# Altium integrated library Integrated_Library1.IntLib: 305 symbols (part 1 of 2)
Pins are listed as number, name and electrical type; pins without a type are passive.

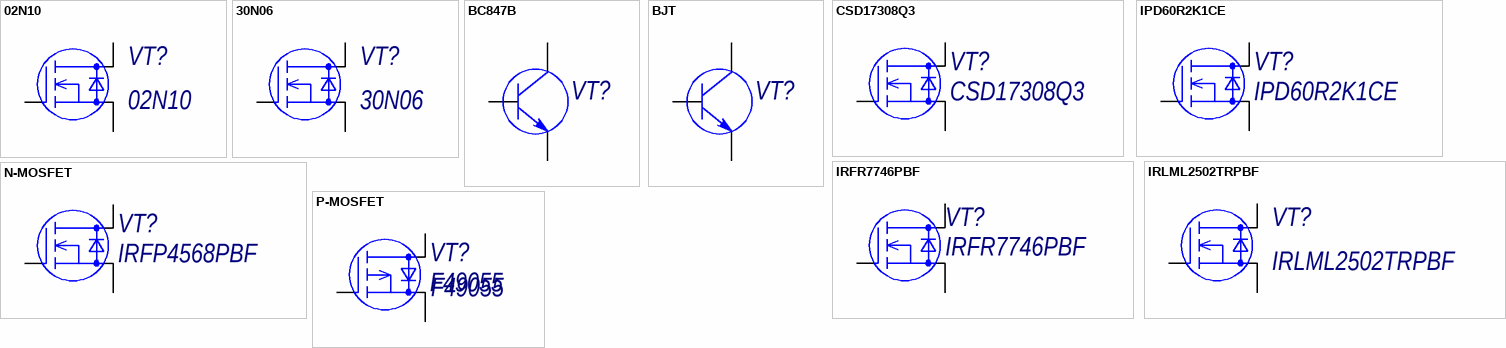
[diagram p0: symbols 02N10 to P-MOSFET]

## 02N10
designator VT?
N-MOSFET 100В 2А; Manufacturer: Hottech Co. Ltd; Name: 02N10
footprint SOT23-3 (SOT23, 3-Leads, Body 2,90x2,30mm, Pitch 0,95mm, IPC Medium Density)
pins: 1 G, 2 S, 3 D

## 30N06
designator VT?
N-MOSFET 60В 30А; Manufacturer: UMW Youtai Semiconductor; Name: 30N06
footprint D-PAK (D-PAK, 3-Pads, Body 6,21x6,73mm (max), IPC High Density)
pins: 1 G, 2 S, 3 D

## BC847B
designator VT?  (value not drawn)
Биполярный NPN транзистор 45В 100мА; Manufacturer: NXP Semiconductor; Name: BC847B
footprint SOT23-3 (SOT23, 3-Leads, Body 2,90x2,30mm, Pitch 0,95mm, IPC Medium Density)
pins: 1, 2, 3

## BJT
designator VT?, comment -  (value not drawn)
Биполярный NPN транзистор; TU: -; Manufacturer: -; Name: -
footprint SOT23-3 (SOT23, 3-Leads, Body 2,90x2,30mm, Pitch 0,95mm, IPC Medium Density)
pins: 1, 2, 3

## CSD17308Q3
designator VT?
N-MOSFET 30В 47А; Manufacturer: Texas Instruments; Name: CSD17308Q3
pins: 1 G, 2 D, 3 S

## IPD60R2K1CE
designator VT?
N-MOSFET 600В 3,7А; Manufacturer: Infineon; Name: IPD60R2K1CE
footprint D-PAK (Footprint not found)
pins: 1 G, 2 D, 3 S

## IRFR7746PBF
designator VT?
N-MOSFET 75В, 56А; Manufacturer: Internationa Rectifier; Name: IRFR7746PBF
footprint D-PAK (D-PAK, 3-Pads, Body 6,21x6,73mm (max), IPC High Density)
pins: 1 G, 2 D, 3 S

## IRLML2502TRPBF
designator VT?
N-MOSFET 20В 4,5А; Manufacturer: International Rectifier; Name: IRLML2502TRPBF
footprint SOT23-3 (SOT23, 3-Leads, Body 2,90x2,30mm, Pitch 0,95mm, IPC Medium Density)
pins: 1 G, 2 S, 3 D

## N-MOSFET
designator VT?, comment IRFP4568PBF
N-MOSFET; Name: IRFP4568PBF; Link: *
footprint D-PAK (D-PAK, 3-Pads, Body 6,21x6,73mm (max), IPC High Density)
pins: 1 G, 2 D, 3 S

## P-MOSFET
designator VT?, comment F49055
P-MOSFET; Manufacturer: IRF; Link: *; Name: F49055
footprint D2PAK
pins: 1 G, 2 D, 3 S


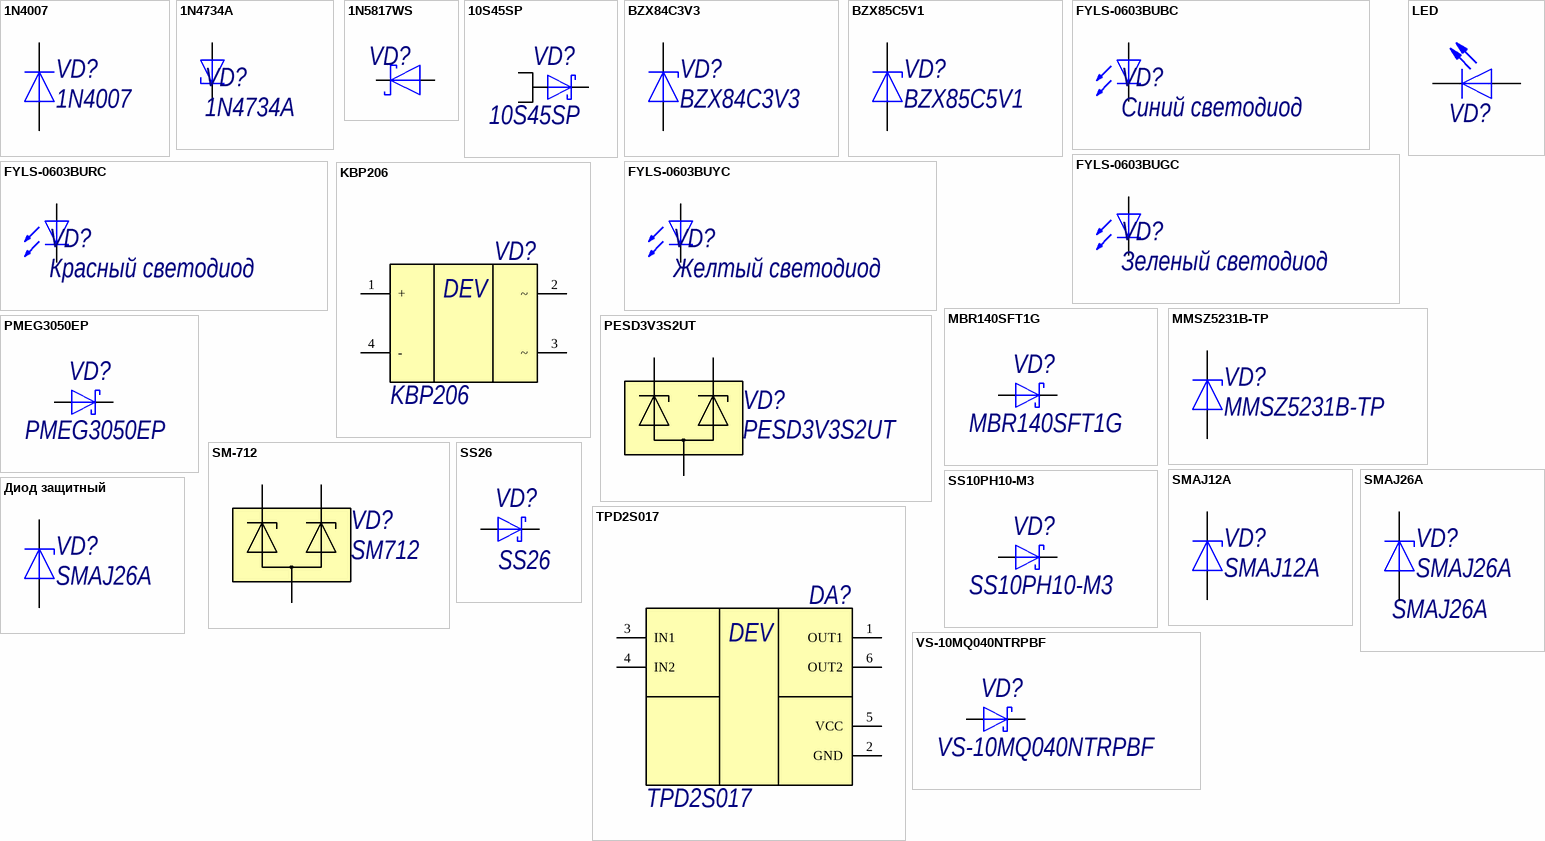
[diagram p1: symbols 1N4007 to Диод защитный]

## 1N4007
designator VD?
Диод выпрямиельный 1000В 1А; Name: 1N4007
pins: 1 A, 3 K

## 1N4734A
designator VD?
Стабилитрон 5.6В, 5%, 1Вт, 1N4734A; Voltage MAX: 5.88; Voltage MIN: 5.32; Name: 1N4734A; ComponentLink1Description: HelpURL; ComponentLink1URL: https://www.promelec.ru/fs/sources/54/98/aa/7a/f161d9308e45db5c55639eb6.pdf
footprint DO-41 (zener diode)
footprint DO-41 Vertical
pins: 1 A, 2 K

## 1N5817WS
designator VD?  (value not drawn)
Диод Шоттки 1N5817WS 20V 1А 0.45V; Производитель: Hottech Co. Ltd; current: 1A; voltage: 20В; drop voltage: 0,45В; Name: 1N5817WS
footprint SOD323
pins: 1 K, 2 A

## 10S45SP
designator VD?
Диод Шоттки 45В 10А; Manufacturer: YFW; Name: 10S45SP
footprint TO-277A (SMPC (TO-277A))
pins: 1 A, 2 A, 3 K

## BZX84C3V3
designator VD?
Стабилитрон 3,3В; Name: BZX84C3V3
footprint SOT23-3 (SOT23, 3-Leads, Body 2,90x2,30mm, Pitch 0,95mm, IPC Medium Density)
pins: 1 A, 3 K

## BZX85C5V1
designator VD?
Стабилитрон 5,1В; Name: BZX85C5V1
pins: 1 A, 3 K

## FYLS-0603BUBC
designator VD?, comment Синий светодиод
Светодтод синий SMD Foryard Optoelectronics Co.; Name: Синий светодиод
footprint VD0603
footprint VD0603 - no point
pins: 1 A, 2 K

## FYLS-0603BUGC
designator VD?, comment Зеленый светодиод
Светодтод зеленый SMD Foryard Optoelectronics Co.; Name: Зеленый светодиод
footprint VD0603
footprint VD0603 - no point
pins: 1 A, 2 K

## FYLS-0603BURC
designator VD?, comment Красный светодиод
Светодтод красный SMD Foryard Optoelectronics Co.; Name: Красный светодиод
footprint VD0603
footprint VD0603 - no point
pins: 1 A, 2 K

## FYLS-0603BUYC
designator VD?, comment Желтый светодиод
Светодтод желтый SMD Foryard Optoelectronics Co.; Name: Желтый светодиод
footprint VD0603
footprint VD0603 - no point
pins: 1 A, 2 K

## KBP206
designator VD?
Диодный мост; Manufacturer: DC Components; Name: KBP206
footprint KBP (Вертикальный диодный мост)
pins: 1 +, 2 ~, 3 ~, 4 -
text: DEV

## LED
designator VD?
Светодиод
footprint LED_0603
pins: 1 K, 2 A

## MBR140SFT1G
designator VD?
Диод Шоттки 40В 1А; Name: MBR140SFT1G
footprint SOD123
pins: 1 K, 2 A

## MMSZ5231B-TP
designator VD?
Стабилитрон 5,1В; Name: MMSZ5231B-TP
footprint SOD123
pins: 1 K, 2 A

## PESD3V3S2UT
designator VD?
Сборка TVS-диодов; Name: PESD3V3S2UT
pins: 1, 2, 3

## PMEG3050EP
designator VD?
Диод Шоттки 30В 5А; Manufacturer: NXP; Name: PMEG3050EP
footprint SOD128
pins: 1 K, 2 A

## SM-712
designator VD?, comment SM712
Сборка TVS-диодов для RS485; Name: SM712
footprint SOT23-3 (SOT23, 3-Leads, Body 2,90x2,30mm, Pitch 0,95mm, IPC Medium Density)
pins: 1, 2, 3

## SMAJ12A
designator VD?
Диод защитный 12В; Name: SMAJ12A
pins: 1 K, 2 A

## SMAJ26A
designator VD?
Диод защитный; Name: SMAJ26A
footprint SMA
pins: 1 K, 2 A

## SS10PH10-M3
designator VD?
Диод Шоттки 100В 10А; Manufacturer: Vishay; Name: SS10PH10-M3
footprint TO-277A (SMPC (TO-277A))
pins: 1 K, 2 A

## SS26
designator VD?
Диод Шоттки 60В 2А; Manufacturer: Vishay Intertechnology; Name: SS26
footprint SMA
pins: 1 K, 2 A

## TPD2S017
designator DA?
ESD защита; Manufacturer: Texas Instruments; Name: TPD2S017
footprint SOT23-6
pins: 1 OUT1, 2 GND, 3 IN1, 4 IN2, 5 VCC, 6 OUT2
text: DEV

## VS-10MQ040NTRPBF
designator VD?
Диод Шоттки 40В 1,5А; Manufacturer: Vishay; Name: VS-10MQ040NTRPBF
footprint SMA
pins: 1 K, 2 A

## Диод защитный
designator VD?, comment SMAJ26A
Диод защитный; Name: SMAJ26A
pins: 1 K, 2 A


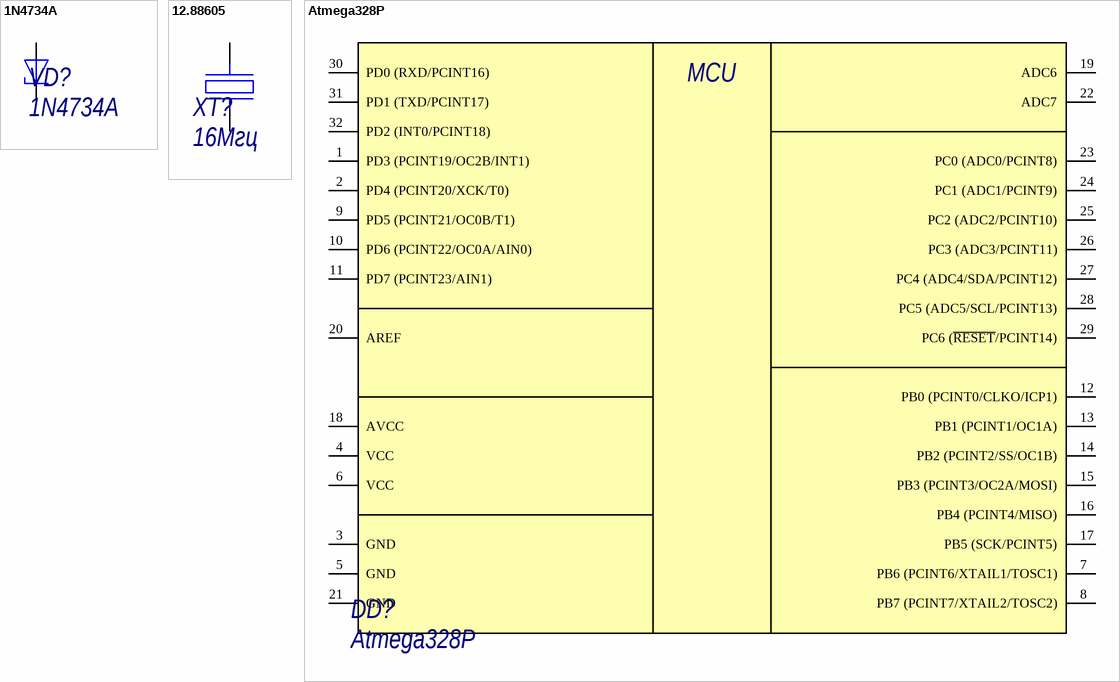
[diagram p2: symbols 1N4734A to Atmega328P]

## 1N4734A
designator VD?
стабилитрон 5,6В; Name: 1N4734A
footprint DO-41 (zener diode)
footprint DO-41 Vertical
footprint SOD323
footprint SOD123
pins: 1 A, 2 K

## 12.88605
designator XT?, comment 16Мгц
Резонатор / Geyer; Name: 12.88605; Value: 16Мгц
footprint KX-7
pins: 1, 3

## Atmega328P
designator DD?
Atmega328P-MU; Name: Atmega328P
footprint VQFN32
pins: 1 PD3 (PCINT19/OC2B/INT1), 2 PD4 (PCINT20/XCK/T0), 3 GND, 4 VCC, 5 GND, 6 VCC, 7 PB6 (PCINT6/XTAIL1/TOSC1), 8 PB7 (PCINT7/XTAIL2/TOSC2), 9 PD5 (PCINT21/OC0B/T1), 10 PD6 (PCINT22/OC0A/AIN0), 11 PD7 (PCINT23/AIN1), 12 PB0 (PCINT0/CLKO/ICP1), 13 PB1 (PCINT1/OC1A), 14 PB2 (PCINT2/SS/OC1B), 15 PB3 (PCINT3/OC2A/MOSI), 16 PB4 (PCINT4/MISO), 17 PB5 (SCK/PCINT5), 18 AVCC, 19 ADC6, 20 AREF, 21 GND, 22 ADC7, 23 PC0 (ADC0/PCINT8), 24 PC1 (ADC1/PCINT9), 25 PC2 (ADC2/PCINT10), 26 PC3 (ADC3/PCINT11), 27 PC4 (ADC4/SDA/PCINT12), 28 PC5 (ADC5/SCL/PCINT13), 29 PC6 (~{RESET}/PCINT14), 30 PD0 (RXD/PCINT16), 31 PD1 (TXD/PCINT17), 32 PD2 (INT0/PCINT18)
text: MCU

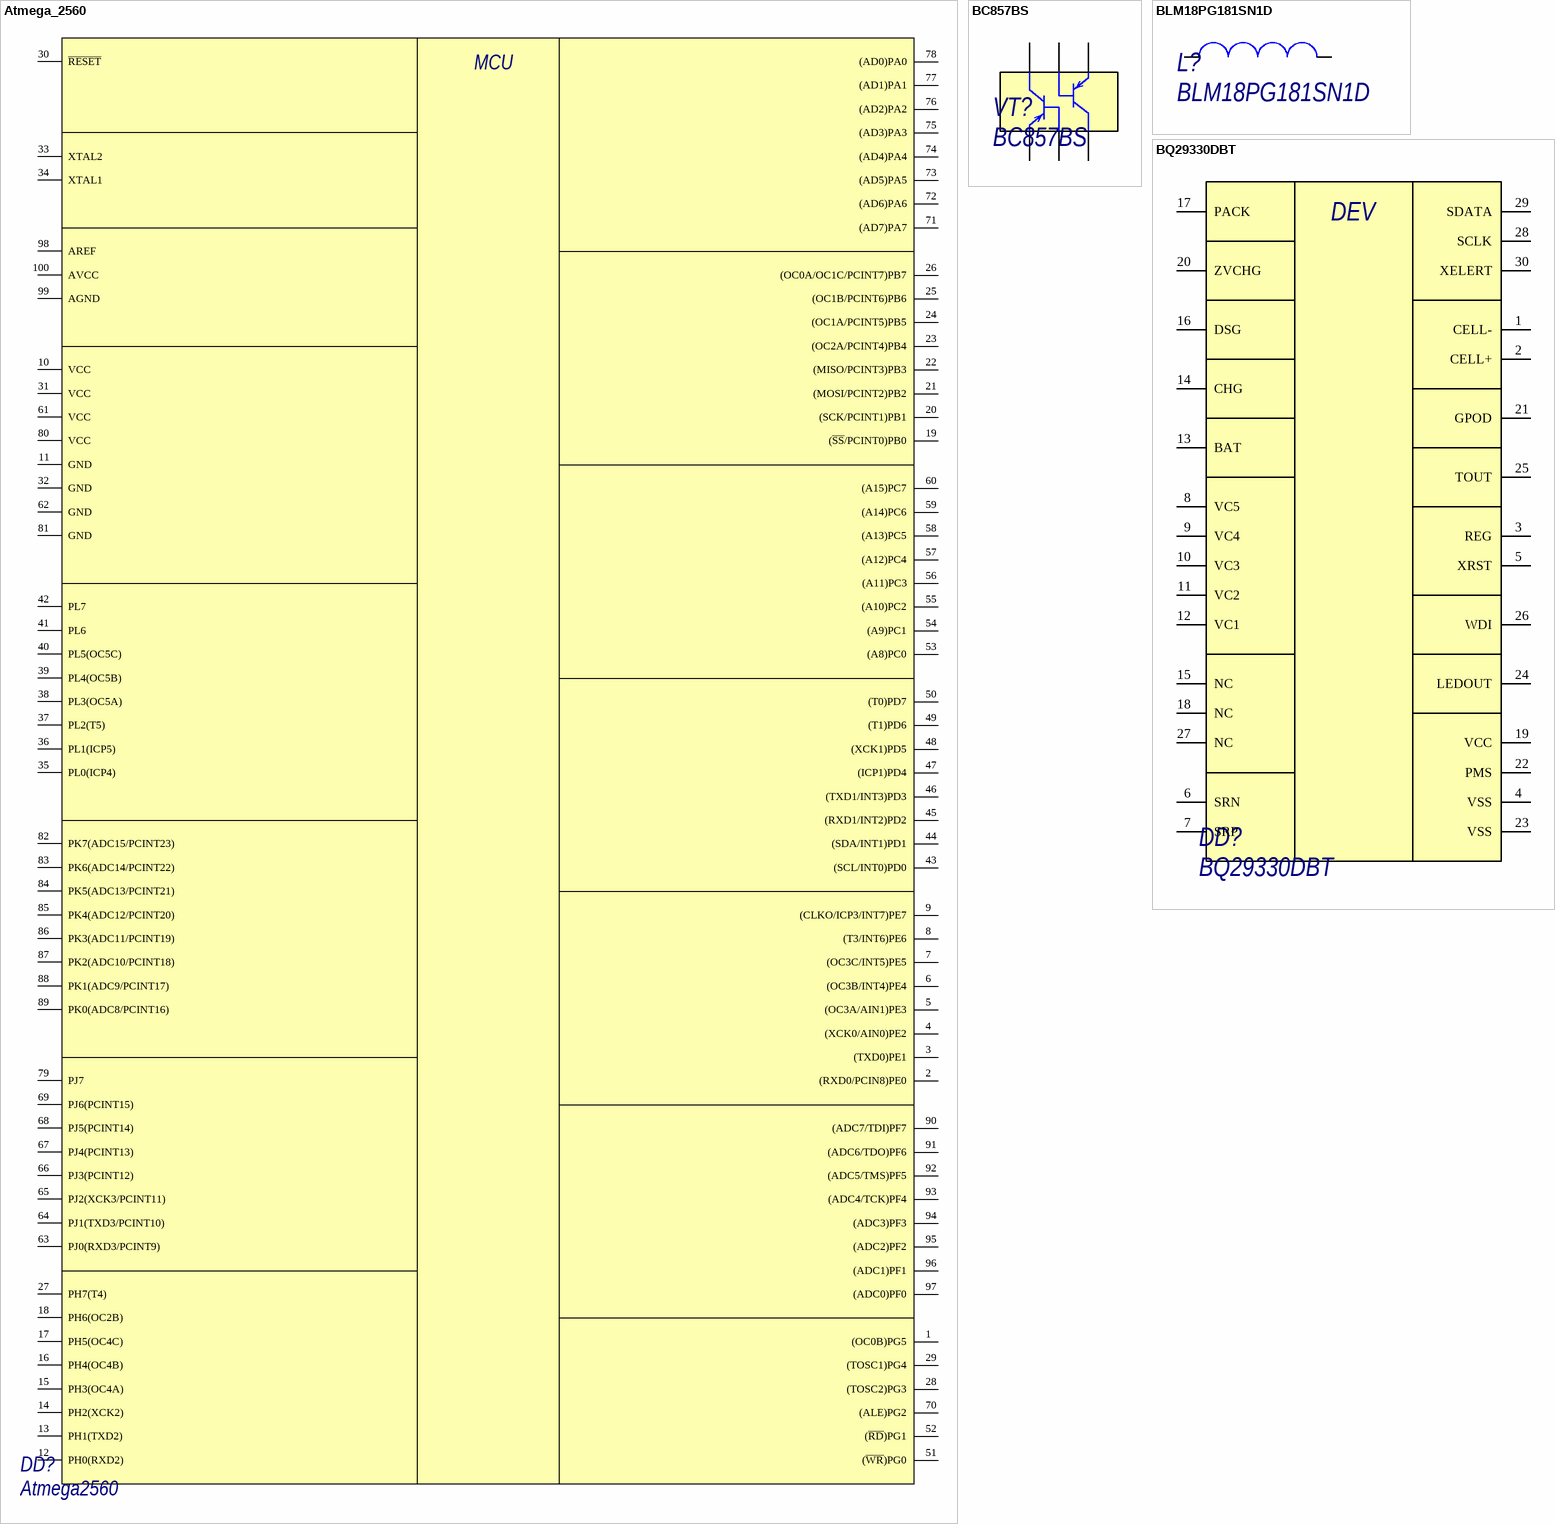
[diagram p3: symbols Atmega_2560 to BQ29330DBT]

## Atmega_2560
designator DD?, comment Atmega2560
Name: Atmega2560
footprint 100A (atmega2560)
pins: 1 (OC0B)PG5, 2 (RXD0/PCIN8)PE0, 3 (TXD0)PE1, 4 (XCK0/AIN0)PE2, 5 (OC3A/AIN1)PE3, 6 (OC3B/INT4)PE4, 7 (OC3C/INT5)PE5, 8 (T3/INT6)PE6, 9 (CLKO/ICP3/INT7)PE7, 10 VCC, 11 GND, 12 PH0(RXD2), 13 PH1(TXD2), 14 PH2(XCK2), 15 PH3(OC4A), 16 PH4(OC4B), 17 PH5(OC4C), 18 PH6(OC2B), 19 (~{SS}/PCINT0)PB0, 20 (SCK/PCINT1)PB1, 21 (MOSI/PCINT2)PB2, 22 (MISO/PCINT3)PB3, 23 (OC2A/PCINT4)PB4, 24 (OC1A/PCINT5)PB5, 25 (OC1B/PCINT6)PB6, 26 (OC0A/OC1C/PCINT7)PB7, 27 PH7(T4), 28 (TOSC2)PG3, 29 (TOSC1)PG4, 30 ~{RESET}, 31 VCC, 32 GND, 33 XTAL2, 34 XTAL1, 35 PL0(ICP4), 36 PL1(ICP5), 37 PL2(T5), 38 PL3(OC5A), 39 PL4(OC5B), 40 PL5(OC5C), 41 PL6, 42 PL7, 43 (SCL/INT0)PD0, 44 (SDA/INT1)PD1, 45 (RXD1/INT2)PD2, 46 (TXD1/INT3)PD3, 47 (ICP1)PD4, 48 (XCK1)PD5, 49 (T1)PD6, 50 (T0)PD7, 51 (~{WR})PG0, 52 (~{RD})PG1, 53 (A8)PC0, 54 (A9)PC1, 55 (A10)PC2, 56 (A11)PC3, 57 (A12)PC4, 58 (A13)PC5, 59 (A14)PC6, 60 (A15)PC7, 61 VCC, 62 GND, 63 PJ0(RXD3/PCINT9), 64 PJ1(TXD3/PCINT10), 65 PJ2(XCK3/PCINT11), 66 PJ3(PCINT12), 67 PJ4(PCINT13), 68 PJ5(PCINT14), 69 PJ6(PCINT15), 70 (ALE)PG2, 71 (AD7)PA7, 72 (AD6)PA6, 73 (AD5)PA5, 74 (AD4)PA4, 75 (AD3)PA3, 76 (AD2)PA2, 77 (AD1)PA1, 78 (AD0)PA0, 79 PJ7, 80 VCC, 81 GND, 82 PK7(ADC15/PCINT23), 83 PK6(ADC14/PCINT22), 84 PK5(ADC13/PCINT21), 85 PK4(ADC12/PCINT20), 86 PK3(ADC11/PCINT19), 87 PK2(ADC10/PCINT18), 88 PK1(ADC9/PCINT17), 89 PK0(ADC8/PCINT16), 90 (ADC7/TDI)PF7, 91 (ADC6/TDO)PF6, 92 (ADC5/TMS)PF5, 93 (ADC4/TCK)PF4, 94 (ADC3)PF3, 95 (ADC2)PF2, 96 (ADC1)PF1, 97 (ADC0)PF0, 98 AREF, 99 AGND, 100 AVCC
text: MCU

## BC857BS
designator VT?
двойной транзистор BC857BS; Name: BC857BS
pins: 1, 2, 3, 4, 5, 6

## BLM18PG181SN1D
designator L?
Феритовая бусина 180 Ом @ 100МГц; Name: BLM18PG181SN1D
footprint L0603
pins: 1, 2

## BQ29330DBT
designator DD?
Монитор батареи 2-4S; Name: BQ29330DBT
pins: 1 CELL-, 2 CELL+, 3 REG, 4 VSS, 5 XRST, 6 SRN, 7 SRP, 8 VC5, 9 VC4, 10 VC3, 11 VC2, 12 VC1, 13 BAT, 14 CHG, 15 NC, 16 DSG, 17 PACK, 18 NC, 19 VCC, 20 ZVCHG, 21 GPOD, 22 PMS, 23 VSS, 24 LEDOUT, 25 TOUT, 26 WDI, 27 NC, 28 SCLK, 29 SDATA, 30 XELERT
text: DEV

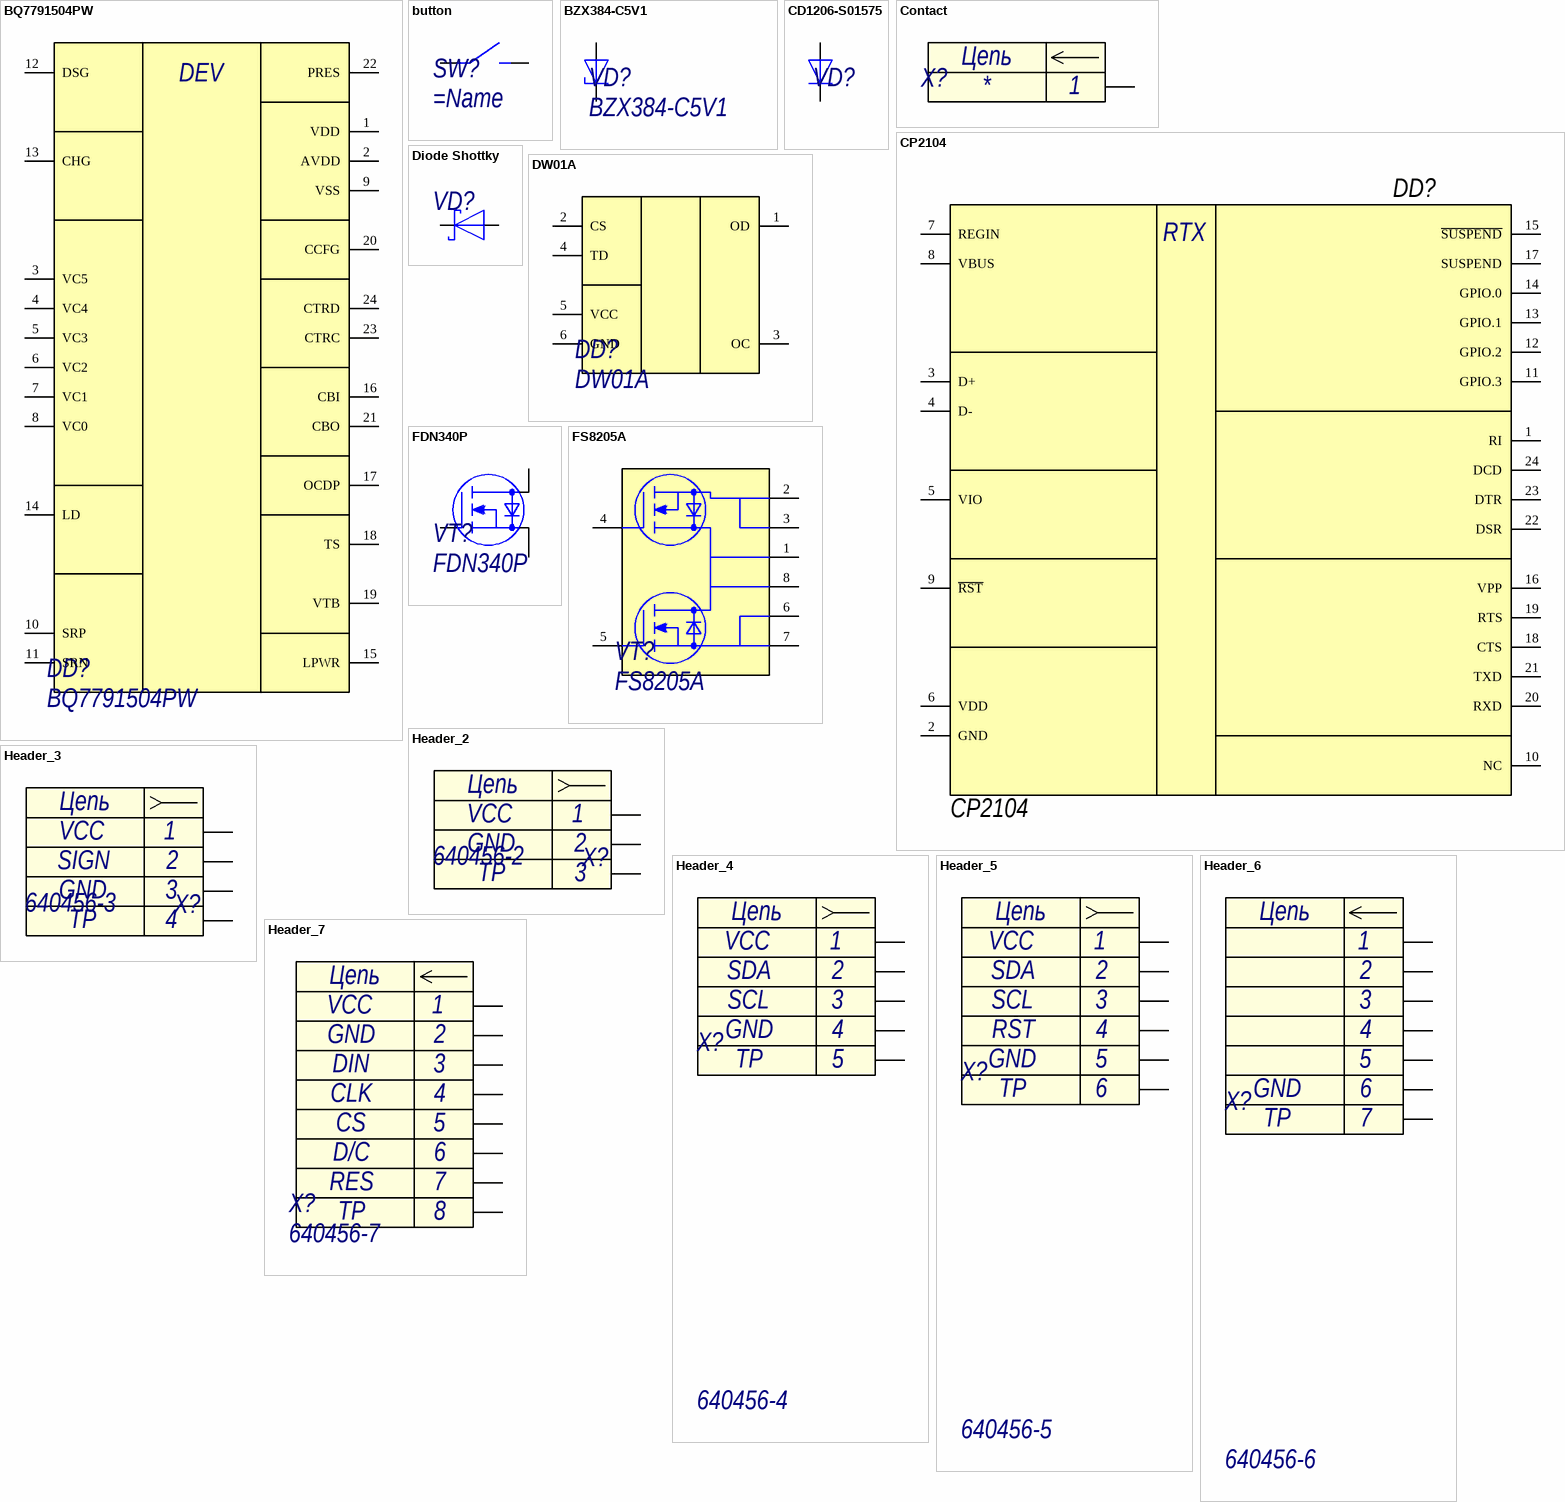
[diagram p4: symbols BQ7791504PW to Header_7]

## BQ7791504PW
designator DD?
Монитор батареи 3-5S; Name: BQ7791504PW
footprint TSSOP24 (Shrink Small Outline; 24 Leads; Body Width 4.4 mm; Pitch 0.65 mm)
pins: 1 VDD, 2 AVDD, 3 VC5, 4 VC4, 5 VC3, 6 VC2, 7 VC1, 8 VC0, 9 VSS, 10 SRP, 11 SRN, 12 DSG, 13 CHG, 14 LD, 15 LPWR, 16 CBI, 17 OCDP, 18 TS, 19 VTB, 20 CCFG, 21 CBO, 22 PRES, 23 CTRC, 24 CTRD
text: DEV

## button
designator SW?
footprint it-1187 (switch)
pins: 1, 2

## BZX384-C5V1
designator VD?
стабилитрон 5,1В; Name: BZX384-C5V1
footprint DO-41 (zener diode)
footprint DO-41 Vertical
footprint SOD323
footprint SOD123
pins: 1 A, 2 K

## CD1206-S01575
designator VD?
диод
footprint DO-214AC (Molded Diode, 2-Leads, Body 4,30x2,70mm, IPC Medium Density)
pins: 1 K, 2 A

## Contact
designator X?
Контакт; Contact_1: *
footprint PAD 10 X 5
pins: 1
text: Цепь

## CP2104
designator DD?
Наименование: CP2104
footprint QFN24-PAD (CP2104(Primary))
pins: 1 RI, 2 GND, 3 D+, 4 D-, 5 VIO, 6 VDD, 7 REGIN, 8 VBUS, 9 ~{RST}, 10 NC, 11 GPIO.3, 12 GPIO.2, 13 GPIO.1, 14 GPIO.0, 15 ~{SUSPEND}, 16 VPP, 17 SUSPEND, 18 CTS, 19 RTS, 20 RXD, 21 TXD, 22 DSR, 23 DTR, 24 DCD
text: RTX

## Diode Shottky
designator VD?  (value not drawn)
Диод Шоттки; Name: *
footprint SOD323
footprint SOD123
pins: 1 K, 2 A

## DW01A
designator DD?
контроллер заряда; Name: DW01A
footprint SOT23-6 (SOT95P280X145-6N, SOT23, 6-Leads, Body 2,90x2,80mm, Pitch 0,95mm, IPC Medium Density)
pins: 1 OD, 2 CS, 3 OC, 4 TD, 5 VCC, 6 GND

## FDN340P
designator VT?
Name: FDN340P
footprint SOT23 (mosfet)
pins: 1 G, 2 S, 3 D

## FS8205A
designator VT?
мофсфет; Name: FS8205A
footprint TSSOP-8
pins: 1 D12, 2 S1, 3 S1, 4 G1, 5 G2, 6 S2, 7 S2, 8 D12

## Header_2
designator X?, comment 640456-2
Разъем - 2 конт. розетка; Contact_1: VCC; Contact_2: GND; Contact_3: TP; Name: 640456-2
footprint JST-640456-2
footprint Clik-Mate 2
footprint 53048-0210
footprint CWF-2
footprint CWF-2R
footprint MW-2M
footprint MW-2MR
pins: 0, 1, 2
text: Цепь; 3

## Header_3
designator X?, comment 640456-3
Разъем - 3 конт. розетка; Contact_1: VCC; Contact_2: SIGN; Contact_3: GND; Contact_4: TP; Name: 640456-3
footprint JST-640456-3
footprint Clik-Mate 3 (5054050370)
footprint CWF-3
pins: 0, 1, 2, 3
text: Цепь; 4

## Header_4
designator X?, comment 640456-4
Разъем - 4 конт. мама; Contact_1: VCC; Contact_2: SDA; Contact_3: SCL; Contact_4: GND; Contact_5: TP; Name: 640456-4
footprint JST-640456-4
footprint Clik-Mate 4 (5054050470)
footprint CWF-4
pins: 0, 1, 2, 3, 4
text: Цепь; 5

## Header_5
designator X?, comment 640456-5
Разъем - 5 конт. мама; Contact_1: VCC; Contact_2: SDA; Contact_3: SCL; Contact_4: RST; Contact_5: GND; Contact_6: TP; Name: 640456-5
footprint JST-640456-5
footprint Clik-Mate 5 (5054050670)
footprint CWF-5
pins: 0, 1, 2, 3, 4, 5
text: Цепь; 6

## Header_6
designator X?, comment 640456-6
Разъем - 6 конт. мама; Contact_6: GND; Contact_7: TP; Name: 640456-6
footprint JST-640456-6
footprint CWF-6
pins: 0, 1, 2, 3, 4, 5, 6
text: Цепь; 7

## Header_7
designator X?, comment 640456-7
Разъем - 7 конт. мама; Contact_1: VCC; Contact_2: GND; Contact_3: DIN; Contact_4: CLK; Contact_5: CS; Contact_6: D/C; Contact_7: RES; Contact_8: TP; Name: 640456-7
footprint JST-640456-7
footprint Clik-Mate 7 (505405-0770)
footprint 2+5P Header
footprint LCP UL94-V0 (FFC мама 7 контактов)
pins: 0, 1, 2, 3, 4, 5, 6, 7
text: Цепь; 8

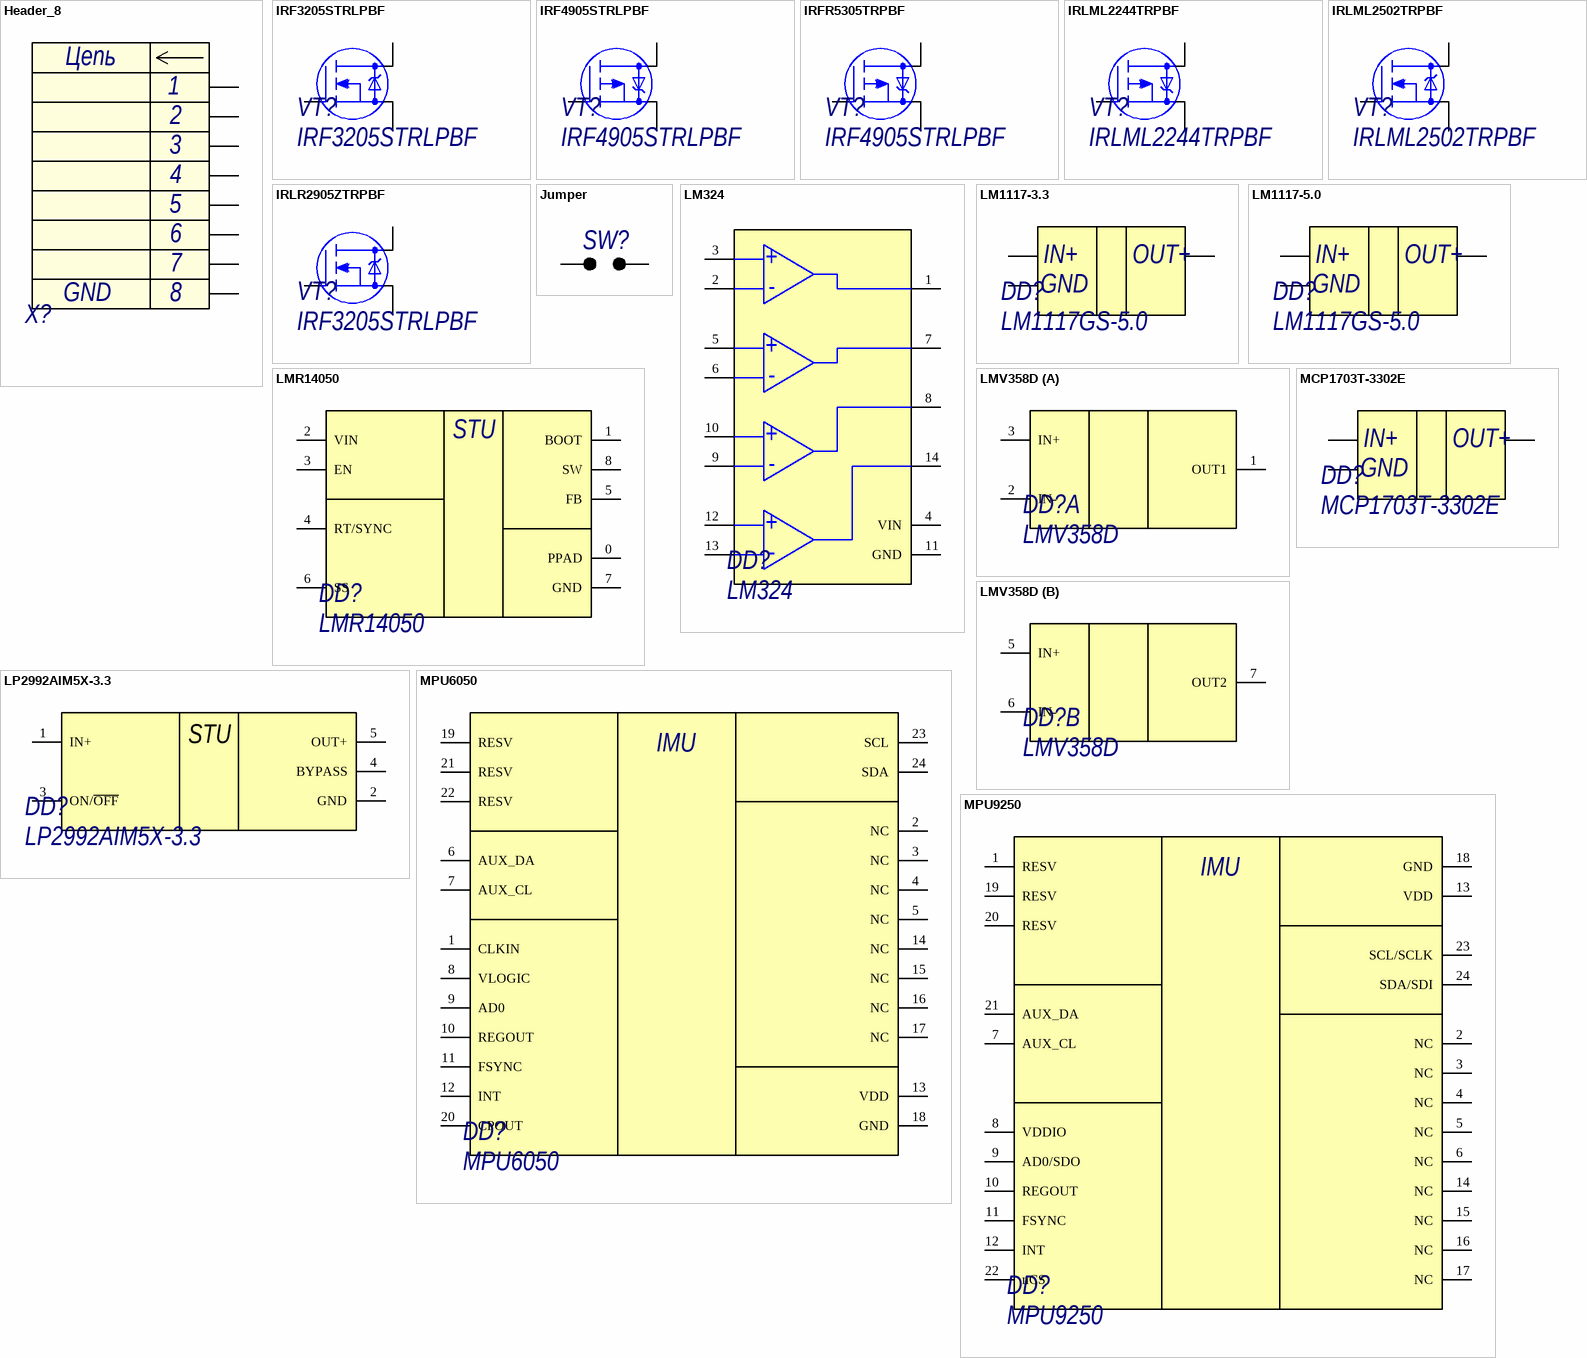
[diagram p5: symbols Header_8 to MPU9250]

## Header_8
designator X?
Разъем - 8 конт. мама; Contact_8: GND
pins: 0, 1, 2, 3, 4, 5, 6, 7
text: Цепь; 8

## IRF3205STRLPBF
designator VT?
Транзистор полевой N-канальный 55В 110А 200Вт; Name: IRF3205STRLPBF
footprint D2PAK
pins: 1 G, 2 S, 3 D

## IRF4905STRLPBF
designator VT?
Транзистор полевой P-канальный 55В 42А 170Вт; Name: IRF4905STRLPBF
footprint D2PAK
pins: 1 G, 2 S, 3 D

## IRFR5305TRPBF
designator VT?, comment IRF4905STRLPBF
Транзистор полевой P-канальный -55В -31А 110Вт 0,065Ом; Name: IRF4905STRLPBF
footprint D2PAK
pins: 1 G, 2 S, 3 D

## IRLML2244TRPBF
designator VT?
мосфет p-канал IRLML2244TRPBF; Name: IRLML2244TRPBF
footprint SOT23 (mosfet)
pins: 1 G, 2 S, 3 D

## IRLML2502TRPBF
designator VT?
мосфет n-канал IRLML2502TRPBF; Name: IRLML2502TRPBF
footprint SOT23 (mosfet)
pins: 1 G, 2 S, 3 D

## IRLR2905ZTRPBF
designator VT?, comment IRF3205STRLPBF
Транзистор полевой N-канальный 55В 42А 110Вт; Name: IRF3205STRLPBF
footprint D2PAK
pins: 1 G, 2 S, 3 D

## Jumper
designator SW?
Запаиваемая перемычка
footprint Jumper_0.5x1
footprint Jumper_1x1 (1x1)
pins: 1, 2

## LM324
designator DD?
Name: LM324
footprint TSSOP-14
footprint SO-14
pins: 1, 2, 3, 4 VIN, 5, 6, 7, 8, 9, 10, 11 GND, 12, 13, 14
text: +; -

## LM1117-3.3
designator DD?, comment LM1117GS-5.0
LM1117GS-3.3; Contact_1: IN+; Contact_2: GND; Contact_3: OUT+; Name: LM1117GS-5.0
footprint SOT-223 (MC33269)
pins: 1, 2, 3

## LM1117-5.0
designator DD?, comment LM1117GS-5.0
Contact_1: IN+; Contact_2: GND; Contact_3: OUT+; Name: LM1117GS-5.0
footprint SOT-223 (MC33269)
pins: 1, 2, 3

## LMR14050
designator DD?
Name: LMR14050
footprint SOIC-8 with PAD
pins: 0 PPAD, 1 BOOT, 2 VIN, 3 EN, 4 RT/SYNC, 5 FB, 6 SS, 7 GND, 8 SW
text: STU

## LMV358D
designator DD?
Name: LMV358D
footprint SOIC-8 (LMV358)
part A pins: 1 OUT1, 2 IN-, 3 IN+
part B pins: 5 IN+, 6 IN-, 7 OUT2

## LP2992AIM5X-3.3
designator DD?
LP2992AIM5X-3.3 стабилизатор напряжения 3,3В; Name: LP2992AIM5X-3.3
footprint SOT23-5
pins: 1 IN+, 2 GND, 3 ON/~{OFF}, 4 BYPASS, 5 OUT+
text: STU

## MCP1703T-3302E
designator DD?
MCP1703T-3302E стабилизатор напряжения 3,3В; Contact_1: IN+; Contact_2: GND; Contact_3: OUT+; Name: MCP1703T-3302E
footprint SOT23 (mosfet)
pins: 1, 2, 3

## MPU6050
designator DD?
Name: MPU6050
footprint QFN24-PAD (QFN 24Pin)
pins: 1 CLKIN, 2 NC, 3 NC, 4 NC, 5 NC, 6 AUX_DA, 7 AUX_CL, 8 VLOGIC, 9 AD0, 10 REGOUT, 11 FSYNC, 12 INT, 13 VDD, 14 NC, 15 NC, 16 NC, 17 NC, 18 GND, 19 RESV, 20 CPOUT, 21 RESV, 22 RESV, 23 SCL, 24 SDA
text: IMU

## MPU9250
designator DD?
Name: MPU9250
pins: 1 RESV, 2 NC, 3 NC, 4 NC, 5 NC, 6 NC, 7 AUX_CL, 8 VDDIO, 9 AD0/SDO, 10 REGOUT, 11 FSYNC, 12 INT, 13 VDD, 14 NC, 15 NC, 16 NC, 17 NC, 18 GND, 19 RESV, 20 RESV, 21 AUX_DA, 22 nCS, 23 SCL/SCLK, 24 SDA/SDI
text: IMU

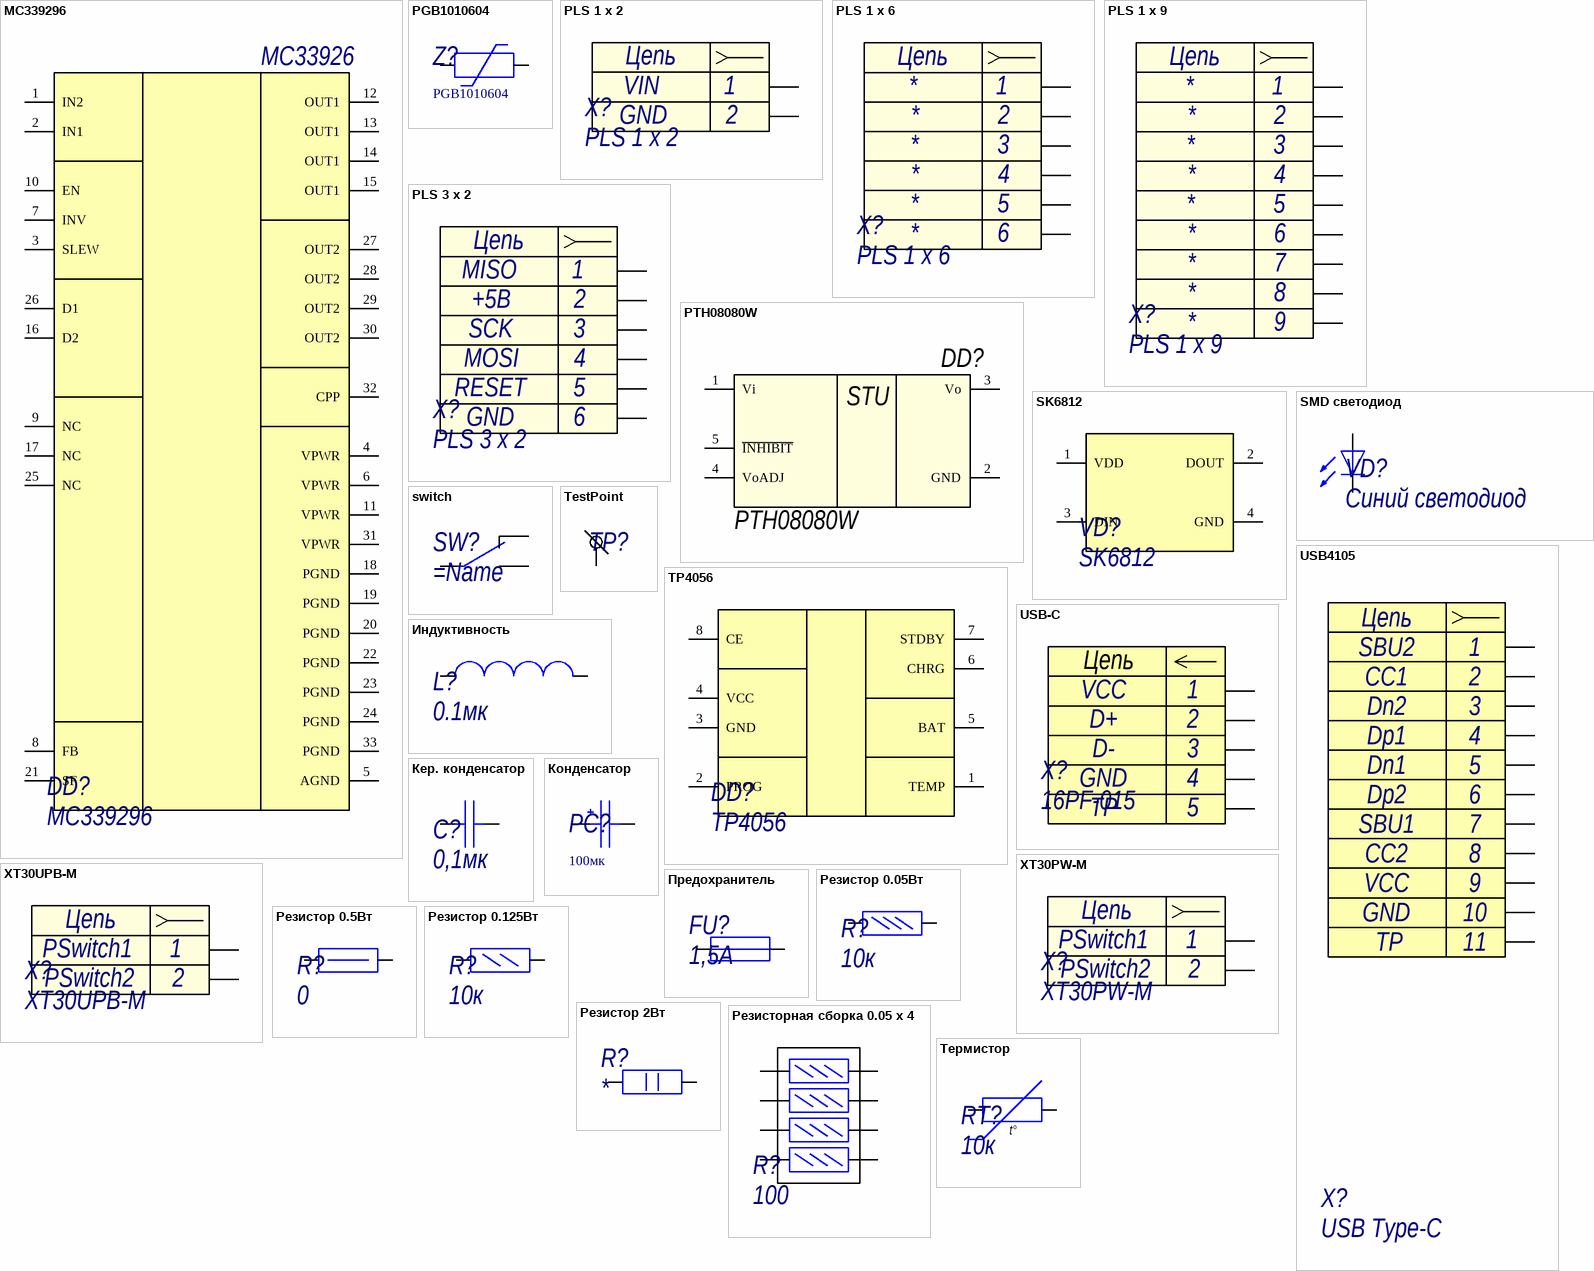
[diagram p6: symbols MС339296 to Термистор]

## MС339296
designator DD?
Name: MС339296
footprint PQFN32
pins: 1 IN2, 2 IN1, 3 SLEW, 4 VPWR, 5 AGND, 6 VPWR, 7 INV, 8 FB, 9 NC, 10 EN, 11 VPWR, 12 OUT1, 13 OUT1, 14 OUT1, 15 OUT1, 16 D2, 17 NC, 18 PGND, 19 PGND, 20 PGND, 21 SF, 22 PGND, 23 PGND, 24 PGND, 25 NC, 26 D1, 27 OUT2, 28 OUT2, 29 OUT2, 30 OUT2, 31 VPWR, 32 CPP, 33 PGND
text: MC33926

## PGB1010604
designator Z?
Name: PGB1010604
footprint защитный диод (PGB1010604)
pins: 1, 2

## PLS 1 x 2
designator X?
Contact_1: VIN; Contact_2: GND; Name: PLS 1 x 2
pins: 1, 2
text: Цепь

## PLS 1 x 6
designator X?
Contact_1: *; Contact_2: *; Contact_3: *; Contact_4: *; Contact_5: *; Contact_6: *; Name: PLS 1 x 6
footprint PLS2-6 - emty
pins: 1, 2, 3, 4, 5, 6